# Altium footprint library Tomra_Cadstar_Footprints.PcbLib: 380 footprints (part 14 of 24)
Each footprint in its own frame and in the unit in brackets; x right, y up, seen from the top. Pads: shape width x height; smd on the part's side, far side on the other; paste and mask are expansions set on the pad; w line width, h text height; cw(c..) or ccw(c..) is an arc to the next point about the centre after c.
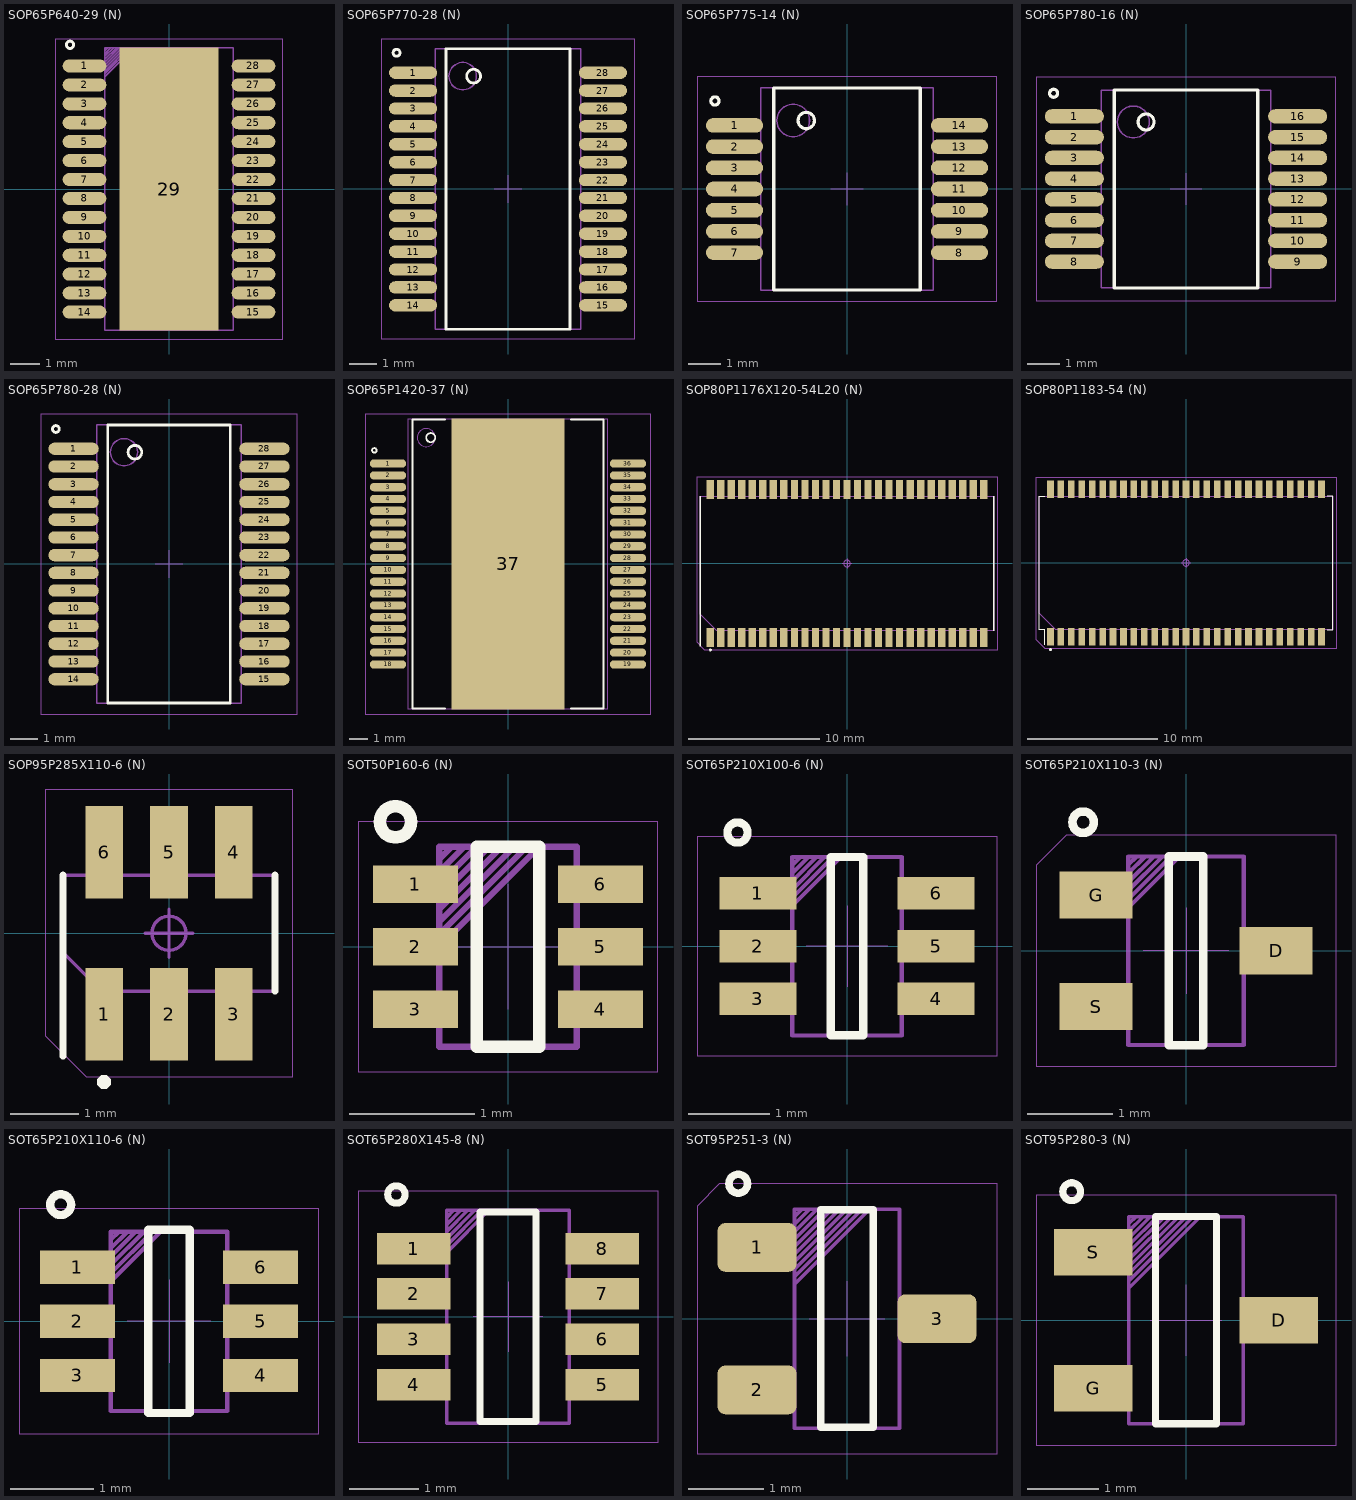
[diagram p13: the footprints below, top view; thin cyan lines are the x and y axes]

## SOP65P640-29 (N) [mm]
height 1.2
pads (29):
  oval 1.5x0.45 smd paste+0 mask+0: 1(-2.9,4.225) 2(-2.9,3.575) 3(-2.9,2.925) 4(-2.9,2.275) 5(-2.9,1.625) 6(-2.9,0.975) 7(-2.9,0.325) 8(-2.9,-0.325) 9(-2.9,-0.975) 10(-2.9,-1.625) 11(-2.9,-2.275) 12(-2.9,-2.925) 13(-2.9,-3.575) 14(-2.9,-4.225) 15(2.9,-4.225) 16(2.9,-3.575) 17(2.9,-2.925) 18(2.9,-2.275) 19(2.9,-1.625) 20(2.9,-0.975) 21(2.9,-0.325) 22(2.9,0.325) 23(2.9,0.975) 24(2.9,1.625) 25(2.9,2.275) 26(2.9,2.925) 27(2.9,3.575) 28(2.9,4.225)
  rect 3.4x9.7 smd paste+0 mask+0: 29(0,0)
Top Silk:
  lines w0.1: -3.525,4.95 cw(c-3.4,4.95) -3.275,4.95 cw(c-3.4,4.95) -3.525,4.95
  text ".Designator" at -3.599,-0.35 h0.7
Top Assembly:
  lines w0.05: -2.2,3.85 -1.2,4.85 ; -2.2,3.95 -1.3,4.85 ; -2.2,4.05 -1.4,4.85 ; -2.2,4.15 -1.5,4.85 ; -2.2,4.25 -1.6,4.85 ; -2.2,4.35 -1.7,4.85 ; -2.2,4.45 -1.8,4.85 ; -2.2,4.55 -1.9,4.85 ; -2.2,4.65 -2,4.85 ; -2.2,4.75 -2.1,4.85 ; -2.2,-4.85 2.2,-4.85 2.2,4.85 -2.2,4.85 -2.2,-4.85
Top Placement:
  lines w0.01: -0.5,0 0.5,0 ; 0,-0.5 0,0.5 ; -3.9,-5.15 3.9,-5.15 3.9,5.15 -3.9,5.15 -3.9,-5.15

## SOP65P770-28 (N) [mm]
height 2
pads (28):
  oval 1.75x0.45 smd paste+0 mask+0: 1(-3.45,4.225) 2(-3.45,3.575) 3(-3.45,2.925) 4(-3.45,2.275) 5(-3.45,1.625) 6(-3.45,0.975) 7(-3.45,0.325) 8(-3.45,-0.325) 9(-3.45,-0.975) 10(-3.45,-1.625) 11(-3.45,-2.275) 12(-3.45,-2.925) 13(-3.45,-3.575) 14(-3.45,-4.225) 15(3.45,-4.225) 16(3.45,-3.575) 17(3.45,-2.925) 18(3.45,-2.275) 19(3.45,-1.625) 20(3.45,-0.975) 21(3.45,-0.325) 22(3.45,0.325) 23(3.45,0.975) 24(3.45,1.625) 25(3.45,2.275) 26(3.45,2.925) 27(3.45,3.575) 28(3.45,4.225)
Top Silk:
  lines w0.1: -4.175,4.95 cw(c-4.05,4.95) -3.925,4.95 cw(c-4.05,4.95) -4.175,4.95 ; -2.25,-5.1 2.25,-5.1 2.25,5.1 -2.25,5.1 -2.25,-5.1 ; -1.5,4.1 cw(c-1.25,4.1) -1,4.1 cw(c-1.25,4.1) -1.5,4.1
  text ".Designator" at -3.599,-0.35 h0.7
Top Assembly:
  lines w0.05: -2.645,-5.1 2.645,-5.1 2.645,5.1 -2.645,5.1 -2.645,-5.1 ; -2.145,4.1 cw(c-1.645,4.1) -1.145,4.1 cw(c-1.645,4.1) -2.145,4.1
Top Placement:
  lines w0.01: -0.5,0 0.5,0 ; 0,-0.5 0,0.5 ; -4.6,-5.45 4.6,-5.45 4.6,5.45 -4.6,5.45 -4.6,-5.45

## SOP65P775-14 (N) [mm]
height 2
pads (14):
  oval 1.75x0.45 smd paste+0 mask+0: 1(-3.45,1.95) 2(-3.45,1.3) 3(-3.45,0.65) 4(-3.45,0) 5(-3.45,-0.65) 6(-3.45,-1.3) 7(-3.45,-1.95) 8(3.45,-1.95) 9(3.45,-1.3) 10(3.45,-0.65) 11(3.45,0) 12(3.45,0.65) 13(3.45,1.3) 14(3.45,1.95)
Top Silk:
  lines w0.1: -4.175,2.7 cw(c-4.05,2.7) -3.925,2.7 cw(c-4.05,2.7) -4.175,2.7 ; -2.25,-3.1 2.25,-3.1 2.25,3.1 -2.25,3.1 -2.25,-3.1 ; -1.5,2.1 cw(c-1.25,2.1) -1,2.1 cw(c-1.25,2.1) -1.5,2.1
  text ".Designator" at -3.599,-0.35 h0.7
Top Assembly:
  lines w0.05: -2.65,-3.1 2.65,-3.1 2.65,3.1 -2.65,3.1 -2.65,-3.1 ; -2.15,2.1 cw(c-1.65,2.1) -1.15,2.1 cw(c-1.65,2.1) -2.15,2.1
Top Placement:
  lines w0.01: -0.5,0 0.5,0 ; 0,-0.5 0,0.5 ; -4.6,-3.45 4.6,-3.45 4.6,3.45 -4.6,3.45 -4.6,-3.45

## SOP65P780-16 (N) [mm]
height 2
pads (16):
  oval 1.85x0.45 smd paste+0 mask+0: 1(-3.5,2.275) 2(-3.5,1.625) 3(-3.5,0.975) 4(-3.5,0.325) 5(-3.5,-0.325) 6(-3.5,-0.975) 7(-3.5,-1.625) 8(-3.5,-2.275) 9(3.5,-2.275) 10(3.5,-1.625) 11(3.5,-0.975) 12(3.5,-0.325) 13(3.5,0.325) 14(3.5,0.975) 15(3.5,1.625) 16(3.5,2.275)
Top Silk:
  lines w0.1: -4.275,3 cw(c-4.15,3) -4.025,3 cw(c-4.15,3) -4.275,3 ; -2.25,-3.1 2.25,-3.1 2.25,3.1 -2.25,3.1 -2.25,-3.1 ; -1.5,2.1 cw(c-1.25,2.1) -1,2.1 cw(c-1.25,2.1) -1.5,2.1
  text ".Designator" at -3.599,-0.35 h0.7
Top Assembly:
  lines w0.05: -2.65,-3.1 2.65,-3.1 2.65,3.1 -2.65,3.1 -2.65,-3.1 ; -2.15,2.1 cw(c-1.65,2.1) -1.15,2.1 cw(c-1.65,2.1) -2.15,2.1
Top Placement:
  lines w0.01: -0.5,0 0.5,0 ; 0,-0.5 0,0.5 ; -4.7,-3.5 4.7,-3.5 4.7,3.5 -4.7,3.5 -4.7,-3.5

## SOP65P780-28 (N) [mm]
height 2
pads (28):
  oval 1.85x0.45 smd paste+0 mask+0: 1(-3.5,4.225) 2(-3.5,3.575) 3(-3.5,2.925) 4(-3.5,2.275) 5(-3.5,1.625) 6(-3.5,0.975) 7(-3.5,0.325) 8(-3.5,-0.325) 9(-3.5,-0.975) 10(-3.5,-1.625) 11(-3.5,-2.275) 12(-3.5,-2.925) 13(-3.5,-3.575) 14(-3.5,-4.225) 15(3.5,-4.225) 16(3.5,-3.575) 17(3.5,-2.925) 18(3.5,-2.275) 19(3.5,-1.625) 20(3.5,-0.975) 21(3.5,-0.325) 22(3.5,0.325) 23(3.5,0.975) 24(3.5,1.625) 25(3.5,2.275) 26(3.5,2.925) 27(3.5,3.575) 28(3.5,4.225)
Top Silk:
  lines w0.1: -4.275,4.95 cw(c-4.15,4.95) -4.025,4.95 cw(c-4.15,4.95) -4.275,4.95 ; -2.25,-5.1 2.25,-5.1 2.25,5.1 -2.25,5.1 -2.25,-5.1 ; -1.5,4.1 cw(c-1.25,4.1) -1,4.1 cw(c-1.25,4.1) -1.5,4.1
  text ".Designator" at -2.65,5.1 h0.7
Top Assembly:
  lines w0.05: -2.65,-5.1 2.65,-5.1 2.65,5.1 -2.65,5.1 -2.65,-5.1 ; -2.15,4.1 cw(c-1.65,4.1) -1.15,4.1 cw(c-1.65,4.1) -2.15,4.1
Top Placement:
  lines w0.01: -0.5,0 0.5,0 ; 0,-0.5 0,0.5 ; -4.7,-5.5 4.7,-5.5 4.7,5.5 -4.7,5.5 -4.7,-5.5

## SOP65P1420-37 (N) [mm]
height 3.6
pads (37):
  oval 2x0.45 smd paste+0 mask+0: 1(-6.6,5.525) 2(-6.6,4.875) 3(-6.6,4.225) 4(-6.6,3.575) 5(-6.6,2.925) 6(-6.6,2.275) 7(-6.6,1.625) 8(-6.6,0.975) 9(-6.6,0.325) 10(-6.6,-0.325) 11(-6.6,-0.975) 12(-6.6,-1.625) 13(-6.6,-2.275) 14(-6.6,-2.925) 15(-6.6,-3.575) 16(-6.6,-4.225) 17(-6.6,-4.875) 18(-6.6,-5.525) 19(6.6,-5.525) 20(6.6,-4.875) 21(6.6,-4.225) 22(6.6,-3.575) 23(6.6,-2.925) 24(6.6,-2.275) 25(6.6,-1.625) 26(6.6,-0.975) 27(6.6,-0.325) 28(6.6,0.325) 29(6.6,0.975) 30(6.6,1.625) 31(6.6,2.275) 32(6.6,2.925) 33(6.6,3.575) 34(6.6,4.225) 35(6.6,4.875) 36(6.6,5.525)
  rect 6.2x16 smd paste+0 mask+0: 37(0,0)
Top Silk:
  lines w0.1: -3.45,-7.95 -5.25,-7.95 -5.25,7.95 -3.45,7.95 ; 3.45,-7.95 5.25,-7.95 5.25,7.95 3.45,7.95 ; -7.475,6.25 cw(c-7.35,6.25) -7.225,6.25 cw(c-7.35,6.25) -7.475,6.25 ; -4.5,6.95 cw(c-4.25,6.95) -4,6.95 cw(c-4.25,6.95) -4.5,6.95
  text ".Designator" at -7.85,8.25 h0.7
Top Assembly:
  lines w0.05: -5.5,-7.95 5.5,-7.95 5.5,7.95 -5.5,7.95 -5.5,-7.95 ; -5,6.95 cw(c-4.5,6.95) -4,6.95 cw(c-4.5,6.95) -5,6.95
Top Placement:
  lines w0.01: -0.5,0 0.5,0 ; 0,-0.5 0,0.5 ; -7.85,-8.25 7.85,-8.25 7.85,8.25 -7.85,8.25 -7.85,-8.25

## SOP80P1176X120-54L20 (N) [mm]
height 1.2
pads (54):
  rect 0.55x1.44 smd paste+0 mask+0: 1(-10.4,-5.62) 2(-9.6,-5.62) 3(-8.8,-5.62) 4(-8,-5.62) 5(-7.2,-5.62) 6(-6.4,-5.62) 7(-5.6,-5.62) 8(-4.8,-5.62) 9(-4,-5.62) 10(-3.2,-5.62) 11(-2.4,-5.62) 12(-1.6,-5.62) 13(-0.8,-5.62) 14(0,-5.62) 15(0.8,-5.62) 16(1.6,-5.62) 17(2.4,-5.62) 18(3.2,-5.62) 19(4,-5.62) 20(4.8,-5.62) 21(5.6,-5.62) 22(6.4,-5.62) 23(7.2,-5.62) 24(8,-5.62) 25(8.8,-5.62) 26(9.6,-5.62) 27(10.4,-5.62) 28(10.4,5.62) 29(9.6,5.62) 30(8.8,5.62) 31(8,5.62) 32(7.2,5.62) 33(6.4,5.62) 34(5.6,5.62) 35(4.8,5.62) 36(4,5.62) 37(3.2,5.62) 38(2.4,5.62) 39(1.6,5.62) 40(0.8,5.62) 41(0,5.62) 42(-0.8,5.62) 43(-1.6,5.62) 44(-2.4,5.62) 45(-3.2,5.62) 46(-4,5.62) 47(-4.8,5.62) 48(-5.6,5.62) 49(-6.4,5.62) 50(-7.2,5.62) 51(-8,5.62) 52(-8.8,5.62) 53(-9.6,5.62) 54(-10.4,5.62)
Top Silk:
  region: -10.487,-6.567 -10.487,-6.526 -10.428,-6.467 -10.346,-6.467 -10.287,-6.526 -10.287,-6.567 -10.287,-6.608 -10.346,-6.667 -10.428,-6.667 -10.487,-6.608
  lines w0.1: -11.15,-6.28 -11.15,5.12 ; 11.15,-5.12 11.15,5.12
  text ".Designator" at -3.599,-0.35 h0.7
Top Assembly:
  lines w0.05: -11.15,-3.85 -9.88,-5.12 11.15,-5.12 11.15,5.12 -11.15,5.12 -11.15,-3.85
Top Placement:
  lines w0.01: -11.4,-5.99 -10.8,-6.59 11.4,-6.59 11.4,6.59 -11.4,6.59 -11.4,-5.99
  lines w0.05: -0.35,0 0.35,0 ; 0,-0.35 0,0.35 ; -0.25,0 cw(c0,0) 0.25,0 cw(c0,0) -0.25,0

## SOP80P1183-54 (N) [mm]
height 1.2
pads (54):
  rect 0.51x1.36 smd paste+0 mask+0: 1(-10.4,-5.655) 2(-9.6,-5.655) 3(-8.8,-5.655) 4(-8,-5.655) 5(-7.2,-5.655) 6(-6.4,-5.655) 7(-5.6,-5.655) 8(-4.8,-5.655) 9(-4,-5.655) 10(-3.2,-5.655) 11(-2.4,-5.655) 12(-1.6,-5.655) 13(-0.8,-5.655) 14(0,-5.655) 15(0.8,-5.655) 16(1.6,-5.655) 17(2.4,-5.655) 18(3.2,-5.655) 19(4,-5.655) 20(4.8,-5.655) 21(5.6,-5.655) 22(6.4,-5.655) 23(7.2,-5.655) 24(8,-5.655) 25(8.8,-5.655) 26(9.6,-5.655) 27(10.4,-5.655) 28(10.4,5.655) 29(9.6,5.655) 30(8.8,5.655) 31(8,5.655) 32(7.2,5.655) 33(6.4,5.655) 34(5.6,5.655) 35(4.8,5.655) 36(4,5.655) 37(3.2,5.655) 38(2.4,5.655) 39(1.6,5.655) 40(0.8,5.655) 41(0,5.655) 42(-0.8,5.655) 43(-1.6,5.655) 44(-2.4,5.655) 45(-3.2,5.655) 46(-4,5.655) 47(-4.8,5.655) 48(-5.6,5.655) 49(-6.4,5.655) 50(-7.2,5.655) 51(-8,5.655) 52(-8.8,5.655) 53(-9.6,5.655) 54(-10.4,5.655)
Top Silk:
  region: -10.5,-6.655 -10.5,-6.614 -10.441,-6.555 -10.359,-6.555 -10.3,-6.614 -10.3,-6.655 -10.3,-6.696 -10.359,-6.755 -10.441,-6.755 -10.5,-6.696
  lines w0.01: -10.835,-6.275 -10.835,-5.13 -11.26,-5.13 -11.26,5.13 -10.835,5.13 ; 10.835,-5.13 11.26,-5.13 11.26,5.13 10.835,5.13
  text ".Designator" at 0,0 h0.7
Top Assembly:
  lines w0.05: -11.26,-3.86 -9.99,-5.13 11.26,-5.13 11.26,5.13 -11.26,5.13 -11.26,-3.86
Top Placement:
  lines w0.01: -11.51,-5.88 -10.8,-6.59 11.51,-6.59 11.51,6.59 -11.51,6.59 -11.51,-5.88
  lines w0.05: -0.35,0 0.35,0 ; 0,-0.35 0,0.35 ; -0.25,0 cw(c0,0) 0.25,0 cw(c0,0) -0.25,0

## SOP95P285X110-6 (N) [mm]
height 1.1
pads (6):
  rect 0.55x1.35 smd paste+0 mask+0: 1(-0.95,-1.185) 2(0,-1.185) 3(0.95,-1.185) 4(0.95,1.185) 5(0,1.185) 6(-0.95,1.185)
Top Silk:
  region: -1.05,-2.18 -1.05,-2.139 -0.991,-2.08 -0.909,-2.08 -0.85,-2.139 -0.85,-2.18 -0.85,-2.221 -0.909,-2.28 -0.991,-2.28 -1.05,-2.221
  lines w0.1: -1.55,-1.8 -1.55,0.85 ; 1.55,-0.85 1.55,0.85
  text ".Designator" at 0,0 h0.7
Top Assembly:
  lines w0.05: -1.55,-0.283 -0.983,-0.85 1.55,-0.85 1.55,0.85 -1.55,0.85 -1.55,-0.283
Top Placement:
  lines w0.01: -1.8,-1.51 -1.2,-2.11 1.8,-2.11 1.8,2.11 -1.8,2.11 -1.8,-1.51
  lines w0.05: -0.35,0 0.35,0 ; 0,-0.35 0,0.35 ; -0.25,0 cw(c0,0) 0.25,0 cw(c0,0) -0.25,0

## SOT50P160-6 (N) [mm]
height 0.6
pads (6):
  rect 0.68x0.3 smd paste+0 mask+0: 1(-0.74,0.5) 2(-0.74,0) 3(-0.74,-0.5) 4(0.74,-0.5) 5(0.74,0) 6(0.74,0.5)
Top Silk:
  lines w0.1: -1.025,1 cw(c-0.9,1) -0.775,1 cw(c-0.9,1) -1.025,1 ; -0.25,-0.8 0.25,-0.8 0.25,0.8 -0.25,0.8 -0.25,-0.8
  text ".Designator" at -3.599,-0.35 h0.7
Top Assembly:
  lines w0.05: -0.55,0 0.25,0.8 ; -0.55,0.1 0.15,0.8 ; -0.55,0.2 0.05,0.8 ; -0.55,0.3 -0.05,0.8 ; -0.55,0.4 -0.15,0.8 ; -0.55,0.5 -0.25,0.8 ; -0.55,0.6 -0.35,0.8 ; -0.55,0.7 -0.45,0.8 ; -0.55,-0.8 0.55,-0.8 0.55,0.8 -0.55,0.8 -0.55,-0.8
Top Placement:
  lines w0.01: -0.5,0 0.5,0 ; 0,-0.5 0,0.5 ; -1.2,-1 1.2,-1 1.2,1 -1.2,1 -1.2,-1

## SOT65P210X100-6 (N) [mm]
height 1
pads (6):
  rect 0.95x0.4 smd paste+0 mask+0: 1(-1.1,0.65) 2(-1.1,0) 3(-1.1,-0.65) 4(1.1,-0.65) 5(1.1,0) 6(1.1,0.65)
Top Silk:
  lines w0.1: -1.475,1.4 cw(c-1.35,1.4) -1.225,1.4 cw(c-1.35,1.4) -1.475,1.4 ; -0.2,-1.1 0.2,-1.1 0.2,1.1 -0.2,1.1 -0.2,-1.1
  text ".Designator" at -3.599,-0.35 h0.7
Top Assembly:
  lines w0.05: -0.675,0.5 -0.075,1.1 ; -0.675,0.6 -0.175,1.1 ; -0.675,0.7 -0.275,1.1 ; -0.675,0.8 -0.375,1.1 ; -0.675,0.9 -0.475,1.1 ; -0.675,1 -0.575,1.1 ; -0.675,-1.1 0.675,-1.1 0.675,1.1 -0.675,1.1 -0.675,-1.1
Top Placement:
  lines w0.01: -0.5,0 0.5,0 ; 0,-0.5 0,0.5 ; -1.85,-1.35 1.85,-1.35 1.85,1.35 -1.85,1.35 -1.85,-1.35

## SOT65P210X110-3 (N) [mm]
height 1.1
pads (3):
  rect 0.85x0.55 smd paste+0 mask+0: D(1.05,0) G(-1.05,0.65) S(-1.05,-0.65)
Top Silk:
  lines w0.1: -1.325,1.5 cw(c-1.2,1.5) -1.075,1.5 cw(c-1.2,1.5) -1.325,1.5 ; -0.2,-1.1 0.2,-1.1 0.2,1.1 -0.2,1.1 -0.2,-1.1
  text ".Designator" at 0,0 h0.7
Top Assembly:
  lines w0.05: -0.675,0.5 -0.075,1.1 ; -0.675,0.6 -0.175,1.1 ; -0.675,0.7 -0.275,1.1 ; -0.675,0.8 -0.375,1.1 ; -0.675,0.9 -0.475,1.1 ; -0.675,1 -0.575,1.1 ; -0.675,-1.1 0.675,-1.1 0.675,1.1 -0.675,1.1 -0.675,-1.1
Top Placement:
  lines w0.01: -0.5,0 0.5,0 ; 0,-0.5 0,0.5 ; -1.75,-1.35 1.75,-1.35 1.75,1.35 -1.4,1.35 -1.75,1 -1.75,-1.35

## SOT65P210X110-6 (N) [mm]
height 1.1
pads (6):
  rect 0.9x0.4 smd paste+0 mask+0: 1(-1.1,0.65) 2(-1.1,0) 3(-1.1,-0.65) 4(1.1,-0.65) 5(1.1,0) 6(1.1,0.65)
Top Silk:
  lines w0.1: -1.425,1.4 cw(c-1.3,1.4) -1.175,1.4 cw(c-1.3,1.4) -1.425,1.4 ; -0.25,-1.1 0.25,-1.1 0.25,1.1 -0.25,1.1 -0.25,-1.1
  text ".Designator" at -3.599,-0.35 h0.7
Top Assembly:
  lines w0.05: -0.7,0.475 -0.1,1.075 ; -0.7,0.575 -0.2,1.075 ; -0.7,0.675 -0.3,1.075 ; -0.7,0.775 -0.4,1.075 ; -0.7,0.875 -0.5,1.075 ; -0.7,0.975 -0.6,1.075 ; -0.7,-1.075 0.7,-1.075 0.7,1.075 -0.7,1.075 -0.7,-1.075
Top Placement:
  lines w0.01: -0.5,0 0.5,0 ; 0,-0.5 0,0.5 ; -1.8,-1.35 1.8,-1.35 1.8,1.35 -1.8,1.35 -1.8,-1.35

## SOT65P280X145-8 (N) [mm]
height 1.45
pads (8):
  rect 1.05x0.45 smd paste+0 mask+0: 1(-1.35,0.975) 2(-1.35,0.325) 3(-1.35,-0.325) 4(-1.35,-0.975) 5(1.35,-0.975) 6(1.35,-0.325) 7(1.35,0.325) 8(1.35,0.975)
Top Silk:
  lines w0.1: -1.725,1.75 cw(c-1.6,1.75) -1.475,1.75 cw(c-1.6,1.75) -1.725,1.75 ; -0.4,-1.5 0.4,-1.5 0.4,1.5 -0.4,1.5 -0.4,-1.5
  text ".Designator" at -3.599,-0.35 h0.7
Top Assembly:
  lines w0.05: -0.875,0.925 -0.275,1.525 ; -0.875,1.025 -0.375,1.525 ; -0.875,1.125 -0.475,1.525 ; -0.875,1.225 -0.575,1.525 ; -0.875,1.325 -0.675,1.525 ; -0.875,1.425 -0.775,1.525 ; -0.875,-1.525 0.875,-1.525 0.875,1.525 -0.875,1.525 -0.875,-1.525
Top Placement:
  lines w0.01: -0.5,0 0.5,0 ; 0,-0.5 0,0.5 ; -2.15,-1.8 2.15,-1.8 2.15,1.8 -2.15,1.8 -2.15,-1.8

## SOT95P251-3 (N) [mm]
height 1.12
pads (3):
  rrect31% 1.05x0.65 smd paste+0 mask+0: 1(-1.2,0.95) 2(-1.2,-0.95) 3(1.2,0)
Top Silk:
  lines w0.1: -1.575,1.8 cw(c-1.45,1.8) -1.325,1.8 cw(c-1.45,1.8) -1.575,1.8 ; -0.35,-1.45 0.35,-1.45 0.35,1.45 -0.35,1.45 -0.35,-1.45
  text ".Designator" at -3.599,-0.35 h0.7
Top Assembly:
  lines w0.05: -0.7,0.46 0.3,1.46 ; -0.7,0.56 0.2,1.46 ; -0.7,0.66 0.1,1.46 ; -0.7,0.76 0,1.46 ; -0.7,0.86 -0.1,1.46 ; -0.7,0.96 -0.2,1.46 ; -0.7,1.06 -0.3,1.46 ; -0.7,1.16 -0.4,1.46 ; -0.7,1.26 -0.5,1.46 ; -0.7,1.36 -0.6,1.46 ; -0.7,-1.46 0.7,-1.46 0.7,1.46 -0.7,1.46 -0.7,-1.46
Top Placement:
  lines w0.01: -0.5,0 0.5,0 ; 0,-0.5 0,0.5 ; -2,-1.8 2,-1.8 2,1.8 -1.7,1.8 -2,1.5 -2,-1.8

## SOT95P280-3 (N) [mm]
height 1.35
pads (3):
  rect 1.1x0.65 smd paste+0 mask+0: D(1.3,0) G(-1.3,-0.95) S(-1.3,0.95)
Top Silk:
  lines w0.1: -1.725,1.8 cw(c-1.6,1.8) -1.475,1.8 cw(c-1.6,1.8) -1.725,1.8 ; -0.425,-1.45 0.425,-1.45 0.425,1.45 -0.425,1.45 -0.425,-1.45
  text ".Designator" at -3.599,-0.35 h0.7
Top Assembly:
  lines w0.05: -0.8,0.45 0.2,1.45 ; -0.8,0.55 0.1,1.45 ; -0.8,0.65 0,1.45 ; -0.8,0.75 -0.1,1.45 ; -0.8,0.85 -0.2,1.45 ; -0.8,0.95 -0.3,1.45 ; -0.8,1.05 -0.4,1.45 ; -0.8,1.15 -0.5,1.45 ; -0.8,1.25 -0.6,1.45 ; -0.8,1.35 -0.7,1.45 ; -0.8,-1.45 0.8,-1.45 0.8,1.45 -0.8,1.45 -0.8,-1.45
Top Placement:
  lines w0.01: -0.5,0 0.5,0 ; 0,-0.5 0,0.5 ; -2.1,-1.75 2.1,-1.75 2.1,1.75 -2.1,1.75 -2.1,-1.75